# Altium integrated library Extra_Board_Mini.IntLib: 45 symbols
Pins are listed as number, name and electrical type; pins without a type are passive.

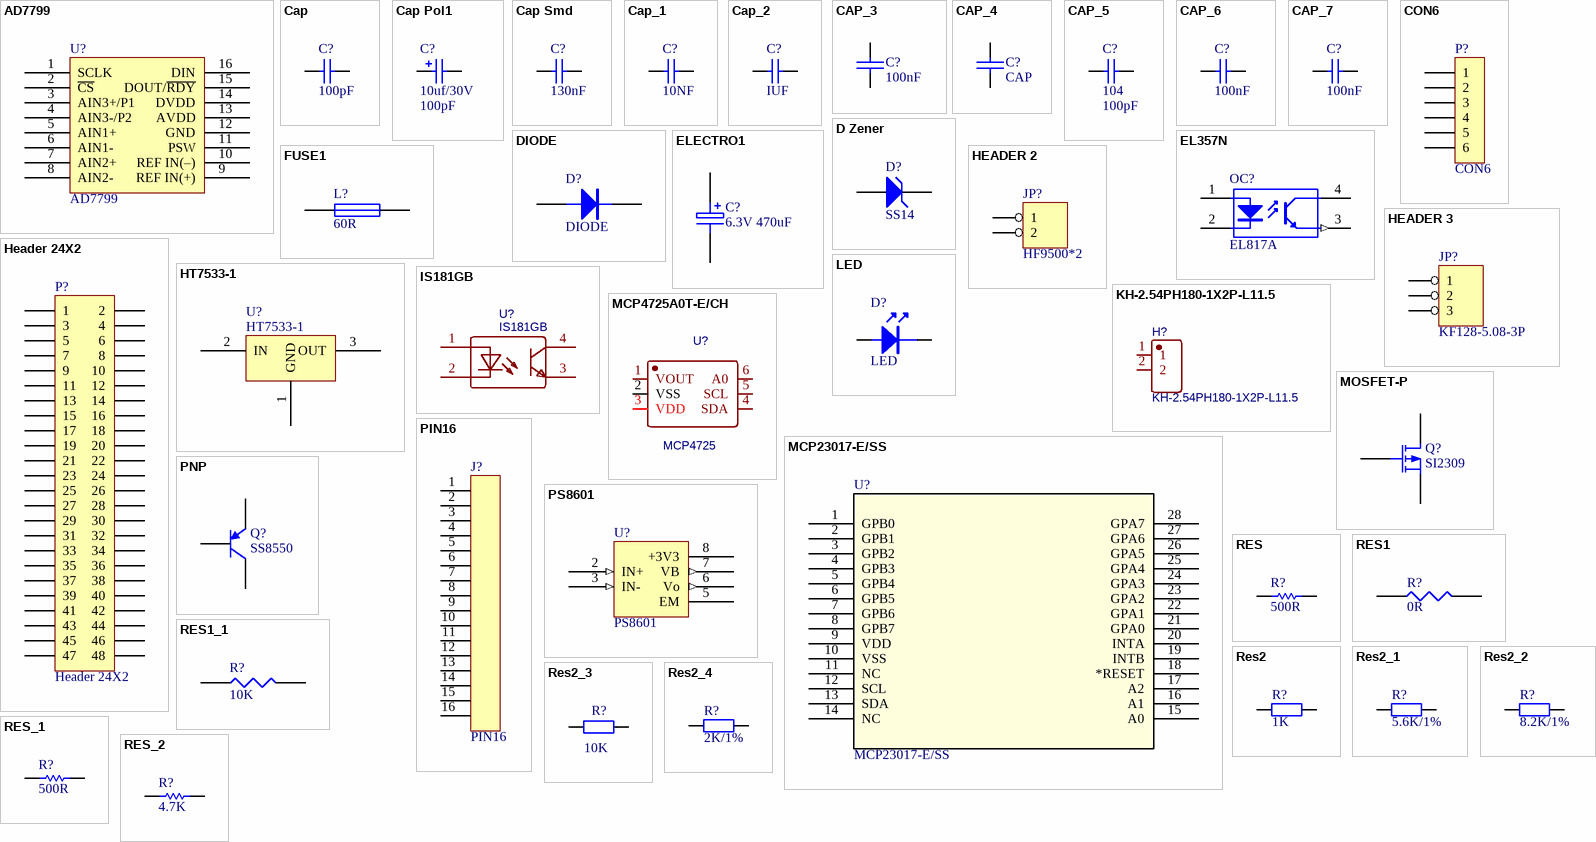
[diagram p0: symbols AD7799 to RES_2]

## AD7799
designator U?
footprint TSSOP16
pins: 1 SCLK, 2 ~{CS}, 3 AIN3+/P1, 4 AIN3-/P2, 5 AIN1+, 6 AIN1-, 7 AIN2+, 8 AIN2-, 9 REF IN(+), 10 REF IN(–), 11 PSW, 12 GND, 13 AVDD, 14 DVDD, 15 DOUT/~{RDY}, 16 DIN

## Cap
designator C?, comment value 100pF  (hidden comment: 104)
Capacitor; Published: 8-Jun-2000; LatestRevisionDate: 17-Jul-2002; LatestRevisionNote: Re-released for DXP Platform.; PackageReference: RAD-0.3; Publisher: Altium Limited; PackageDescription: Radial Cap, Thru-Hole; 2 Leads; 0.3 in Pin Spacing
footprint RAD-0.3 (Radial Cap, Thru-Hole; 2 Leads; 0.3 in Pin Spacing)
simulation model CAP (Capacitor)
signal-integrity model Cap
pins: 1, 2

## Cap Pol1
designator C?, comment 10uf/30V  value 100pF
Polarized Capacitor (Radial); Published: 8-Jun-2000; LatestRevisionDate: 17-Jul-2002; LatestRevisionNote: Re-released for DXP Platform.; PackageReference: RB7.6-15; Publisher: Altium Limited; PackageDescription: Polarized Capacitor (Radial); 2 Leads
footprint RB7.6-15 (Polarized Capacitor (Radial); 2 Leads)
simulation model CAP (Capacitor)
signal-integrity model Cap Pol
pins: 1, 2
1 alternate drawing of the same symbol

## Cap Smd
designator C?, comment 130nF
Capacitor
footprint 0603 (贴片带丝印)
pins: 1, 2

## Cap_1
designator C?, comment 10NF
Capacitor; Value: 100pF; Published: 8-Jun-2000; LatestRevisionDate: 17-Jul-2002; LatestRevisionNote: Re-released for DXP Platform.; PackageReference: RAD-0.3; Publisher: Altium Limited; PackageDescription: Radial Cap, Thru-Hole; 2 Leads; 0.3 in Pin Spacing
footprint RAD-0.3 (Radial Cap, Thru-Hole; 2 Leads; 0.3 in Pin Spacing)
simulation model CAP (Capacitor)
signal-integrity model Cap
pins: 1, 2

## Cap_2
designator C?, comment IUF
Capacitor; Value: 100pF; Published: 8-Jun-2000; LatestRevisionDate: 17-Jul-2002; LatestRevisionNote: Re-released for DXP Platform.; PackageReference: RAD-0.3; Publisher: Altium Limited; PackageDescription: Radial Cap, Thru-Hole; 2 Leads; 0.3 in Pin Spacing
footprint RAD-0.3 (Radial Cap, Thru-Hole; 2 Leads; 0.3 in Pin Spacing)
simulation model CAP (Capacitor)
signal-integrity model Cap
pins: 1, 2

## CAP_3
designator C?, comment 100nF
Capacitor
footprint 0603_C
pins: 1, 2

## CAP_4
designator C?, comment CAP
Capacitor
footprint 0603_C
pins: 1, 2

## CAP_5
designator C?, comment 104  value 100pF
Capacitor; Published: 8-Jun-2000; LatestRevisionDate: 17-Jul-2002; LatestRevisionNote: Re-released for DXP Platform.; PackageReference: RAD-0.3; Publisher: Altium Limited; PackageDescription: Radial Cap, Thru-Hole; 2 Leads; 0.3 in Pin Spacing
footprint RAD-0.3 (Radial Cap, Thru-Hole; 2 Leads; 0.3 in Pin Spacing)
simulation model CAP (Capacitor)
signal-integrity model Cap
pins: 1, 2

## CAP_6
designator C?, comment 100nF
Capacitor; Value: 104; Published: 8-Jun-2000; LatestRevisionDate: 17-Jul-2002; LatestRevisionNote: Re-released for DXP Platform.; PackageReference: RAD-0.3; Publisher: Altium Limited
footprint 0603C
pins: 1, 2

## CAP_7
designator C?, comment 100nF
Capacitor; Value: 104; Published: 8-Jun-2000; LatestRevisionDate: 17-Jul-2002; LatestRevisionNote: Re-released for DXP Platform.; PackageReference: RAD-0.3; Publisher: Altium Limited
footprint 0603C
pins: 1, 2

## CON6
designator P?
Connector
footprint KF128-3.81-6P (螺钉式接线端子，脚距3.81mm)
pins: 1, 2, 3, 4, 5, 6

## D Zener
designator D?, comment SS14
Zener Diode; Published: 8-Jun-2000; Publisher: Altium Limited; LatestRevisionDate: 17-Jul-2002; LatestRevisionNote: Re-released for DXP Platform.; PackageReference: DIODE-0.7; PackageDescription: Diode, Thru-Hole; 2 Leads; 0.7 in Pin Spacing
footprint DIODE-0.7 (Diode, Thru-Hole; 2 Leads; 0.7 in Pin Spacing)
simulation model ZENER (Diode)
signal-integrity model D Zener
pins: 1 A, 2 K

## DIODE
designator D?
footprint 贴片二极管
pins: 1 A, 2 K

## EL357N
designator OC?, comment EL817A
线性光耦
footprint SMD_PC817
pins: 1 A "Anode", 2 K "Cathode", 3 E (out) "Emitter", 4 C "Collector"

## ELECTRO1
designator C?, comment 6.3V 470uF
Electrolytic Capacitor
footprint 0603_C
pins: 1, 2

## FUSE1
designator L?, comment 60R
Fuse
footprint 0603
pins: 1, 2

## HEADER 2
designator JP?, comment HF9500*2
footprint KF128-5.08-2P (螺钉式接线端子，脚距5.08mm)
pins: 1, 2

## HEADER 3
designator JP?, comment KF128-5.08-3P
footprint KF128-5.08-3P (螺钉式接线端子，脚距5.08mm)
pins: 1, 2, 3

## Header 24X2
designator P?
Header, 24-Pin, Dual row; LatestRevisionDate: 17-Jul-2002; LatestRevisionNote: Re-released for DXP Platform.; Publisher: Altium Limited
footprint HDR2X24 (Connector; Header; 24x2 Position)
signal-integrity model Connector
pins: 1, 2, 3, 4, 5, 6, 7, 8, 9, 10, 11, 12, 13, 14, 15, 16, 17, 18, 19, 20, 21, 22, 23, 24, 25, 26, 27, 28, 29, 30, 31, 32, 33, 34, 35, 36, 37, 38, 39, 40, 41, 42, 43, 44, 45, 46, 47, 48

## HT7533-1
designator U?
footprint SOT23
pins: 1 GND, 2 IN, 3 OUT

## IS181GB
designator U?
BOM_Manufacturer: ISOCOM; BOM_Supplier: LCSC; BOM_Manufacturer Part: IS181GB; BOM_Supplier Part: C84196; BOM_JLCPCB Part Class: Extended Part; spicePre: U; spiceSymbolName: IS181GB
footprint SOP-4_L3.9-W4.4-P2.54-LS7.0-TL
pins: 1, 2, 3, 4

## KH-2.54PH180-1X2P-L11.5
designator H?
BOM_Manufacturer: kinghelm(金航标); BOM_Manufacturer Part: KH-2.54PH180-1X4P-L11.5; Contributor: LCSC; BOM_Supplier: LCSC; BOM_Supplier Part: C2905435; spicePre: H; spiceSymbolName: KH-2.54PH180-1X4P-L11.5
footprint 1*2P
pins: 1, 2

## LED
designator D?
LED 发光二极管
footprint LED-0603G
pins: 1 A, 2 K

## MCP4725A0T-E/CH
designator U?, comment MCP4725
BOM_Manufacturer: MICROCHIP; BOM_Manufacturer Part: MCP4725A0T-E/CH; Contributor: LCSC; BOM_Supplier: LCSC; BOM_Supplier Part: C144198; BOM_JLCPCB Part Class: Extended Part; spicePre: U; spiceSymbolName: MCP4725A0T-E/CH
footprint MCP4725
pins: 1 VOUT, 2 VSS, 3 VDD, 4 SDA, 5 SCL, 6 A0

## MCP23017-E/SS
designator U?
No Description Available; Mfr_Name: Microchip; Copyright: Copyright (C) 2021 Ultra Librarian. All rights reserved.; Manufacturer_Part_Number: MCP23017-E/SS; RefDes: RefDes; Type: DEV
footprint SSOP28_MC_MCH
pins: 1 GPB0, 2 GPB1, 3 GPB2, 4 GPB3, 5 GPB4, 6 GPB5, 7 GPB6, 8 GPB7, 9 VDD, 10 VSS, 11 NC, 12 SCL, 13 SDA, 14 NC, 15 A0, 16 A1, 17 A2, 18 *RESET, 19 INTB, 20 INTA, 21 GPA0, 22 GPA1, 23 GPA2, 24 GPA3, 25 GPA4, 26 GPA5, 27 GPA6, 28 GPA7

## MOSFET-P
designator Q?, comment SI2309
P-Channel MOSFET; Published: 8-Jun-2000; LatestRevisionDate: 17-Jul-2002; LatestRevisionNote: Re-released for DXP Platform.; PackageVersion: 1995/1996; PackageReference: E3; Publisher: Altium Limited; PackageDescription: TO, Flat Index; 3 In-Line, Axial Leads; Body Dia. 4.6mm; Lead Dia. 0.5 mm (max)
footprint E3 (TO, Flat Index; 3 In-Line, Axial Leads; Body Dia. 4.6mm; Lead Dia. 0.5 mm (max))
simulation model PMOS (MOSFET-P)
pins: 1 D, 2 G, 3 S

## PIN16
designator J?
footprint KF128-5.08-16P (螺钉式接线端子，脚距5.08mm)
pins: 1, 2, 3, 4, 5, 6, 7, 8, 9, 10, 11, 12, 13, 14, 15, 16

## PNP
designator Q?, comment SS8550
PNP Bipolar Transistor; Published: 8-Jun-2000; LatestRevisionDate: 29-May-2009; LatestRevisionNote: IPC-7351 Footprint Added.; PackageVersion: Aug-1999; PackageReference: SOT-23B; Publisher: Altium Limited; PackageDescription: 3-Pin SOT-23 Package 0.95 mm Pitch, 2.4 mm Lead Span
footprint SOT-23B_N (SOT23, 3-Leads, Body 2.9x1.3mm, Pitch 0.95mm, Lead Span 2.4mm, IPC Medium Density)
footprint SOT-23B_L (SOT23, 3-Leads, Body 2.9x1.3mm, Pitch 0.95mm, Lead Span 2.4mm, IPC High Density)
footprint SOT-23B_M (SOT23, 3-Leads, Body 2.9x1.3mm, Pitch 0.95mm, Lead Span 2.4mm, IPC Low Density)
simulation model PNP
signal-integrity model PNP
pins: 1 C, 2 B, 3 E

## PS8601
designator U?
High speed optocoupler
footprint SMD-8_6.3mm
pins: 1 NC hidden to NC, 2 IN+ (in), 3 IN- (in), 4 NC hidden to NC, 5 EM (power), 6 Vo (out), 7 VB (out), 8 +3V3 (power)

## RES
designator R?, comment 500R
Resistor; Value: 1K; Published: 8-Jun-2000; Revision: July-2002: Re-released for DXP Platform.; Publisher: Altium Limited
footprint 0805R
pins: 1, 2
2 alternate drawings of the same symbol

## RES1
designator R?, comment 0R
footprint 0603_R
pins: 1, 2

## RES1_1
designator R?, comment 10K
footprint 0603
pins: 1, 2

## Res2
designator R?, comment value 1K  (hidden comment: 15R)
Resistor; Published: 8-Jun-2000; LatestRevisionDate: 17-Jul-2002; LatestRevisionNote: Re-released for DXP Platform.; PackageReference: AXIAL-0.4; Publisher: Altium Limited; PackageDescription: Axial Device, Thru-Hole; 2 Leads; 0.4 in Pin Spacing
simulation model RESISTOR (Resistor)
signal-integrity model Res
footprint 0603_R
pins: 1, 2

## Res2_1
designator R?, comment 5.6K/1%
Resistor; Value: 1K; Published: 8-Jun-2000; LatestRevisionDate: 17-Jul-2002; LatestRevisionNote: Re-released for DXP Platform.; PackageReference: AXIAL-0.4; Publisher: Altium Limited; PackageDescription: Axial Device, Thru-Hole; 2 Leads; 0.4 in Pin Spacing
simulation model RESISTOR (Resistor)
signal-integrity model Res
footprint 0603_R
pins: 1, 2

## Res2_2
designator R?, comment 8.2K/1%
Resistor; Value: 1K; Published: 8-Jun-2000; LatestRevisionDate: 17-Jul-2002; LatestRevisionNote: Re-released for DXP Platform.; PackageReference: AXIAL-0.4; Publisher: Altium Limited; PackageDescription: Axial Device, Thru-Hole; 2 Leads; 0.4 in Pin Spacing
simulation model RESISTOR (Resistor)
signal-integrity model Res
footprint 0603_R
pins: 1, 2

## Res2_3
designator R?, comment 10K
Resistor; Value: 1K; Published: 8-Jun-2000; LatestRevisionDate: 17-Jul-2002; LatestRevisionNote: Re-released for DXP Platform.; PackageReference: AXIAL-0.4; Publisher: Altium Limited; PackageDescription: Axial Device, Thru-Hole; 2 Leads; 0.4 in Pin Spacing
simulation model RESISTOR (Resistor)
signal-integrity model Res
footprint 0603_R
pins: 1, 2

## Res2_4
designator R?, comment 2K/1%
Resistor; Value: 1K; Published: 8-Jun-2000; LatestRevisionDate: 17-Jul-2002; LatestRevisionNote: Re-released for DXP Platform.; PackageReference: AXIAL-0.4; Publisher: Altium Limited; PackageDescription: Axial Device, Thru-Hole; 2 Leads; 0.4 in Pin Spacing
simulation model RESISTOR (Resistor)
signal-integrity model Res
footprint 0603_R
pins: 1, 2

## RES_1
designator R?, comment 500R
Resistor; Value: 1K; Published: 8-Jun-2000; Revision: July-2002: Re-released for DXP Platform.; Publisher: Altium Limited
footprint 0805R
pins: 1, 2
2 alternate drawings of the same symbol

## RES_2
designator R?, comment 4.7K
Resistor; Value: 1K; Published: 8-Jun-2000; Revision: July-2002: Re-released for DXP Platform.; Publisher: Altium Limited
footprint 0603R
pins: 1, 2
2 alternate drawings of the same symbol

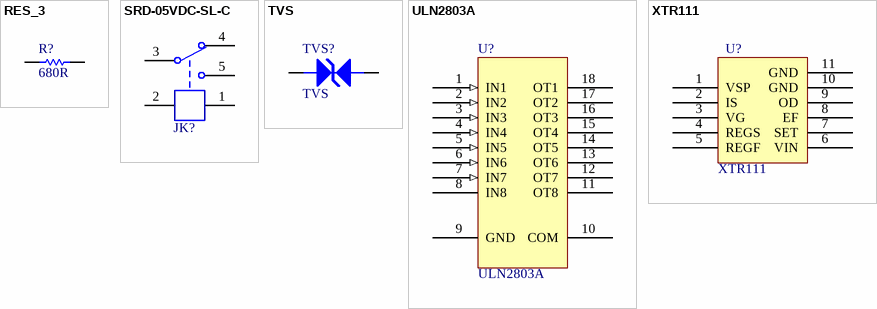
[diagram p1: symbols RES_3 to XTR111]

## RES_3
designator R?, comment 680R
Resistor; Value: 1K; Published: 8-Jun-2000; Revision: July-2002: Re-released for DXP Platform.; Publisher: Altium Limited
footprint 0805R
pins: 1, 2
2 alternate drawings of the same symbol

## SRD-05VDC-SL-C
designator JK?  (value not drawn)
5V一组转换
footprint SRD-C_B (单刀双投)
pins: 1, 2, 3, 4, 5

## TVS
designator TVS?
footprint TVS
pins: 1 A, 2 K

## ULN2803A
designator U?
8 channels Darlington
footprint SOP18 - 300mil
footprint SOP18 - 300mil
pins: 1 IN1 (in), 2 IN2 (in), 3 IN3 (in), 4 IN4 (in), 5 IN5 (in), 6 IN6 (in), 7 IN7 (in), 8 IN8, 9 GND (power), 10 COM (power), 11 OT8, 12 OT7, 13 OT6, 14 OT5, 15 OT4, 16 OT3, 17 OT2, 18 OT1

## XTR111
designator U?
footprint XTR111
footprint XTR111
footprint XTR111
pins: 1 VSP, 2 IS, 3 VG, 4 REGS, 5 REGF, 6 VIN, 7 SET, 8 EF, 9 OD, 10 GND, 11 GND